# Altium footprint library PcbLib1.PcbLib: 102 footprints (part 1 of 7)
Each footprint in its own frame and in the unit in brackets; x right, y up, seen from the top. Pads: shape width x height; smd on the part's side, far side on the other; paste and mask are expansions set on the pad; w line width, h text height; cw(c..) or ccw(c..) is an arc to the next point about the centre after c.
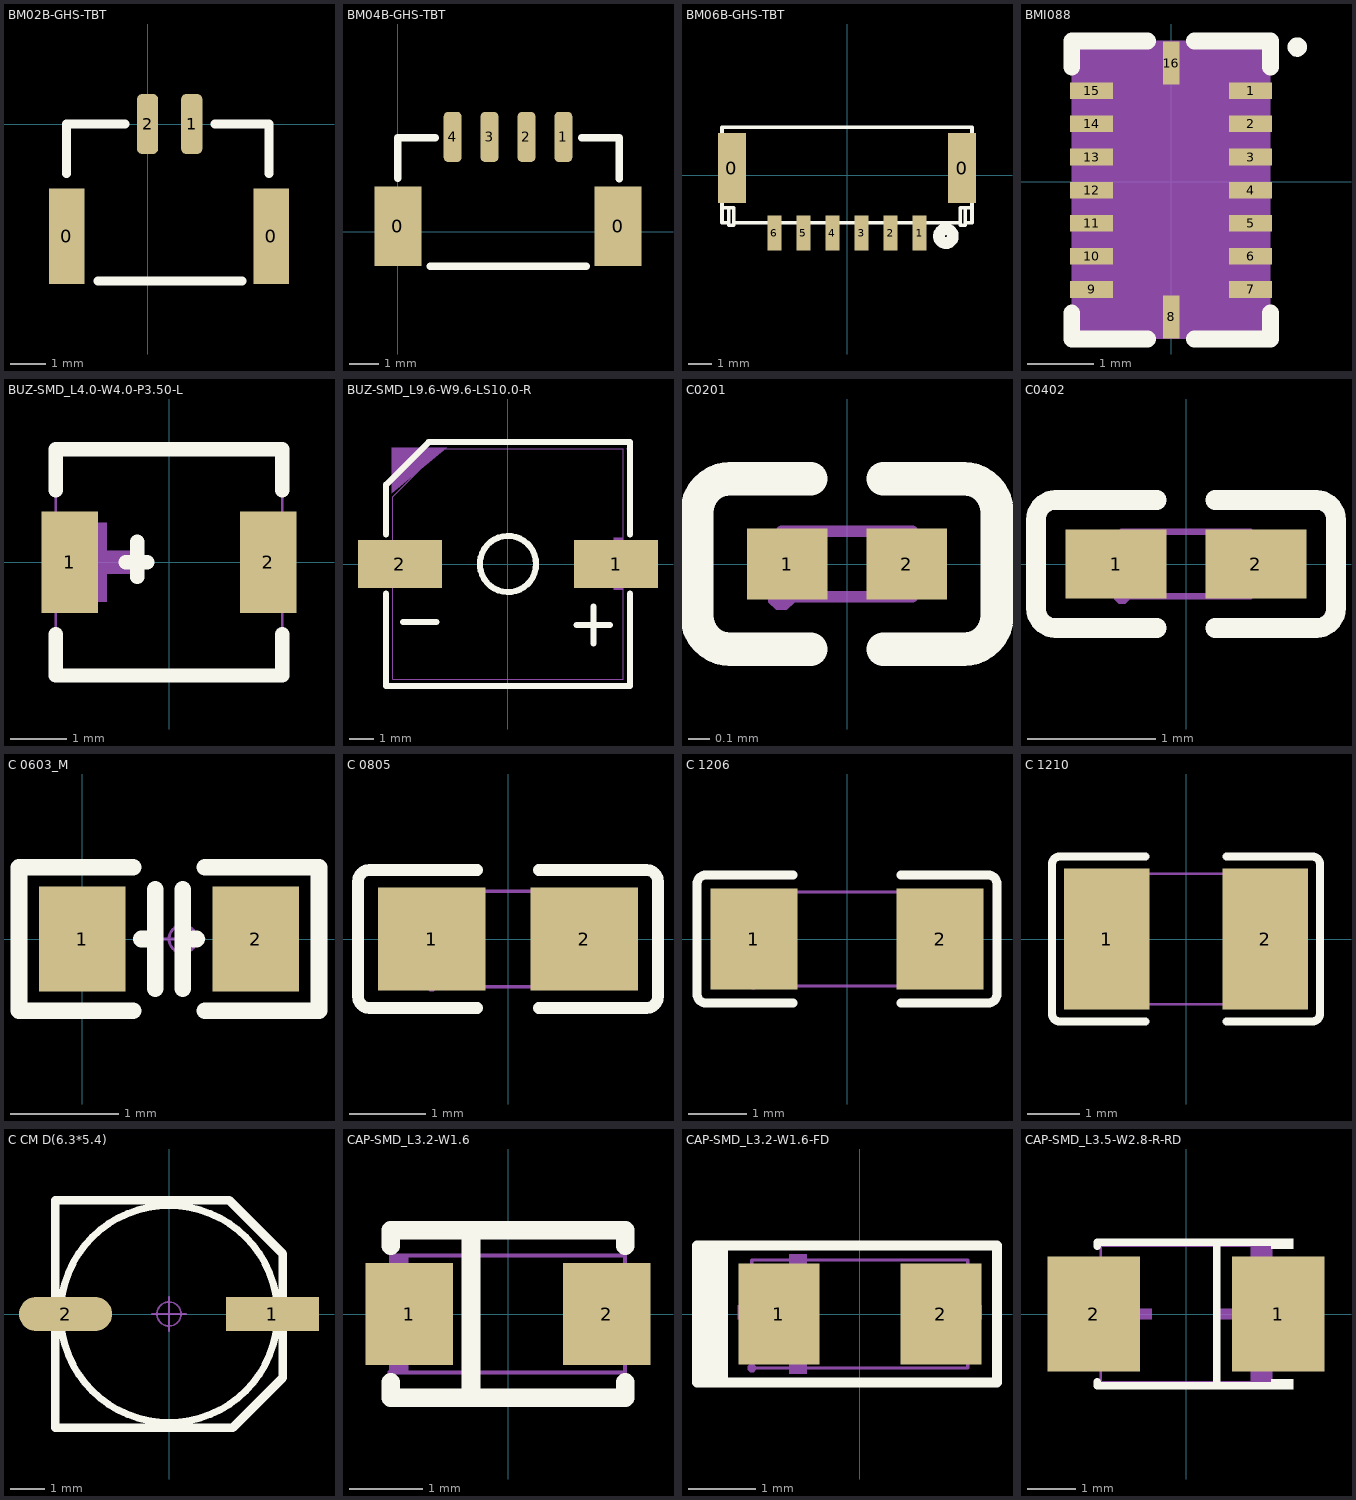
[diagram p0: the footprints below, top view; thin cyan lines are the x and y axes]

## BM02B-GHS-TBT [mm]
pads (4):
  rect 1.016x2.7 smd: 0(-2.286,-3.175) 0(3.5,-3.175)
  rrect50% 0.6x1.7 smd: 1(1.25,0) 2(0,0)
Top Overlay:
  lines w0.254: -2.286,-1.397 -2.286,0 -0.635,0 ; -1.397,-4.445 2.667,-4.445 ; 1.905,0 3.429,0 3.429,-1.397
3D body "SM02B.STEP": height 2.9, standoff -0.1, extent -1.359,-4.445 2.629,0.542

## BM04B-GHS-TBT [mm]
height 1.45
pads (6):
  rect 1.6x2.7 smd: 0(0,0.177) 0(7.45,0.177)
  rrect50% 0.6x1.7 smd: 1(5.6,3.2) 2(4.35,3.2) 3(3.1,3.2) 4(1.85,3.2)
Top Overlay:
  lines w0.254: 0,1.803 0,3.175 1.27,3.175 ; 1.092,-1.168 6.375,-1.168 ; 6.223,3.175 7.493,3.175 7.493,1.778
3D body "User Library-SM04B-GHS-TB.STEP": height 4.25, standoff -0.1, extent -0.366,-1.167 7.884,3.683

## BM06B-GHS-TBT [mm] "A1257WR-S-6P"
height 1.5
pads (8):
  rect 1.2x3 smd: 0(-4.95,0.3) 0(4.95,0.3)
  rect 0.6x1.5 smd: 1(3.125,-2.5) 2(1.875,-2.5) 3(0.625,-2.5) 4(-0.625,-2.5) 5(-1.875,-2.5) 6(-3.125,-2.5)
Top Overlay:
  circle w0.5: c4.251,-2.627 r0.3
  lines w0.102: -3.225,-2.15 -3.225,-2.85 -3.025,-2.85 -3.025,-2.15 ; -1.975,-2.15 -1.975,-2.85 -1.775,-2.85 -1.775,-2.15 ; -0.725,-2.15 -0.725,-2.85 -0.525,-2.85 -0.525,-2.15 ; 0.525,-2.15 0.525,-2.85 0.725,-2.85 0.725,-2.15 ; 1.775,-2.15 1.775,-2.85 1.975,-2.85 1.975,-2.15 ; 3.025,-2.15 3.025,-2.85 3.225,-2.85 3.225,-2.15
  lines w0.152: -5.075,-2.05 -5.375,-2.05 -5.375,-1.4 ; -5.075,-1.4 -5.075,-2.15 -4.875,-2.15 -4.875,-2.05 ; -3.225,-2.05 -3.225,-2.15 -3.025,-2.15 -3.025,-2.05 ; -1.975,-2.05 -1.975,-2.15 -1.775,-2.15 -1.775,-2.05 ; -0.725,-2.05 -0.725,-2.15 -0.525,-2.15 -0.525,-2.05 ; 0.525,-2.05 0.525,-2.15 0.725,-2.15 0.725,-2.05 ; 1.775,-2.05 1.775,-2.15 1.975,-2.15 1.975,-2.05 ; 3.025,-2.05 3.025,-2.15 3.225,-2.15 3.225,-2.05 ; 5.075,-2.05 5.375,-2.05 5.375,-1.4 ; 5.075,-1.4 5.075,-2.15 4.875,-2.15 4.875,-2.05 ; -5.375,-1.4 -5.375,2.05 5.375,2.05 5.375,-1.4 ; -5.375,-1.4 -4.875,-1.4 -4.875,-2.05 ; -4.875,-2.05 4.875,-2.05 ; 4.875,-2.05 4.875,-1.4 5.375,-1.4
3D body "A1257WR-S-6P.stp": height 4.4, standoff 0, extent -5.375,-2.8 5.375,2.1

## BMI088 [mm]
height 5
pads (16):
  rect 0.65x0.25 smd: 1(1.2,1.371) 2(1.2,0.871) 3(1.2,0.371) 4(1.2,-0.129) 5(1.2,-0.629) 6(1.2,-1.129) 7(1.2,-1.629) 9(-1.2,-1.629) 10(-1.2,-1.129) 11(-1.2,-0.629) 12(-1.2,-0.129) 13(-1.2,0.371) 14(-1.2,0.871) 15(-1.2,1.371)
  rect 0.25x0.65 smd: 8(0,-2.042) 16(0,1.788)
Top Overlay:
  circle w0.152: c1.905,2.032 r0.071
  lines w0.254: -1.5,-1.985 -1.5,-2.377 -0.356,-2.377 ; -1.5,1.727 -1.5,2.123 -0.356,2.123 ; 0.356,-2.377 1.5,-2.377 1.5,-1.985 ; 0.356,2.123 1.5,2.123 1.5,1.727
Mechanical 4:
  region: 1.5,2.123 1.5,-2.377 -1.5,-2.377 -1.5,2.123
Mechanical 5:
  region: -1.4,1.496 -0.925,1.496 -0.925,1.246 -1.4,1.246
  region: -1.4,0.996 -0.925,0.996 -0.925,0.746 -1.4,0.746
  region: -1.4,0.496 -0.925,0.496 -0.925,0.246 -1.4,0.246
  region: -1.4,-0.004 -0.925,-0.004 -0.925,-0.254 -1.4,-0.254
  region: -1.4,-0.504 -0.925,-0.504 -0.925,-0.754 -1.4,-0.754
  region: -1.4,-1.004 -0.925,-1.004 -0.925,-1.254 -1.4,-1.254
  region: -1.4,-1.504 -0.925,-1.504 -0.925,-1.754 -1.4,-1.754
  region: 0.925,-1.504 1.4,-1.504 1.4,-1.754 0.925,-1.754
  region: 0.925,-1.004 1.4,-1.004 1.4,-1.254 0.925,-1.254
  region: 0.925,-0.504 1.4,-0.504 1.4,-0.754 0.925,-0.754
  region: 0.925,-0.004 1.4,-0.004 1.4,-0.254 0.925,-0.254
  region: 0.925,0.496 1.4,0.496 1.4,0.246 0.925,0.246
  region: 0.925,0.996 1.4,0.996 1.4,0.746 0.925,0.746
  region: 0.925,1.496 1.4,1.496 1.4,1.246 0.925,1.246
  region: -0.125,2.023 0.125,2.023 0.125,1.548 -0.125,1.548
  region: -0.125,-1.802 0.125,-1.802 0.125,-2.277 -0.125,-2.277
Mechanical 6:
  circle w0.06: c1.5,2.123 r0.03
3D body "LGA-16.STEP": height 1, standoff 0, extent -1.5,-2.377 1.5,2.123

## BUZ-SMD_L4.0-W4.0-P3.50-L [mm]
pads (2):
  rect 1x1.8 smd: 1(-1.75,0) 2(1.75,0)
Top Overlay:
  lines w0.254: -2,-1.27 -2,-2 2,-2 2,-1.27 ; -2,1.27 -2,2 2,2 2,1.27 ; -0.762,0 -0.381,0 ; -0.56,-0.26 -0.56,0.36
Mechanical 6:
  region: -2.1,0.2 -1.5,0.2 -1.5,0.7 -1.1,0.7 -1.1,0.2 -0.5,0.2 -0.5,-0.2 -1.1,-0.2 -1.1,-0.7 -1.5,-0.7 -1.5,-0.2 -2.1,-0.2
Mechanical 15:
  region: -1.94,-2 -1.94,-1.975 -1.975,-1.94 -2.025,-1.94 -2.06,-1.975 -2.06,-2 -2.06,-2.025 -2.025,-2.06 -1.975,-2.06 -1.94,-2.025
  region: 1.5,0.7 2,0.7 2,-0.7 1.5,-0.7
  region: -2,0.7 -1.5,0.7 -1.5,-0.7 -2,-0.7
  lines w0.051: -2,-2 -2,2 2,2 2,-2 -2,-2
3D body "SMD,4x4mm.STEP": height 2.01, standoff 0, extent -2,-2 2,2.01

## BUZ-SMD_L9.6-W9.6-LS10.0-R [mm]
pads (2):
  rect 3.5x2 smd: 1(4.5,0) 2(-4.5,0)
Top Overlay:
  circle w0.254: c0.001,0 r1.171
  lines w0.254: -5.079,-1.232 -5.079,-5.08 5.081,-5.08 5.081,-1.231 ; -5.079,1.232 -5.079,3.302 -3.301,5.08 5.081,5.08 5.081,1.231 ; -4.381,-2.413 -2.984,-2.413 ; 2.858,-2.54 4.255,-2.54 ; 3.557,-3.302 3.557,-1.778
Mechanical 6:
  region: -2.55,4.85 -4.85,4.85 -4.85,2.95
  region: -5.508,0.191 -3.349,0.191 -3.349,-0.191 -5.508,-0.191
  region: 4.41,-1.07 4.41,1.089 4.791,1.089 4.791,-1.07
  region: 3.493,0.191 5.652,0.191 5.652,-0.191 3.493,-0.191
Mechanical 15:
  region: -3.3,-0.75 -5,-0.75 -5,0.75 -3.3,0.75
  region: 3.3,0.75 5,0.75 5,-0.75 3.3,-0.75
  region: 5.06,4.8 5.06,4.825 5.025,4.86 4.975,4.86 4.94,4.825 4.94,4.8 4.94,4.775 4.975,4.74 5.025,4.74 5.06,4.775
  lines w0.051: -4.8,-4.8 -4.8,2.8 -2.8,4.8 4.8,4.8 4.8,-4.8 -4.8,-4.8

## C0201 [mm]
pads (2):
  rect 0.368x0.324 smd paste-100 mask+0.051: 1(-0.274,0) 2(0.274,0)
Top Overlay:
  lines w0.152: -0.166,-0.391 -0.535,-0.391 cw(c-0.535,-0.238) -0.687,-0.238 -0.687,0.238 cw(c-0.535,0.238) -0.535,0.391 -0.166,0.391 ; 0.166,-0.391 0.535,-0.391 ccw(c0.535,-0.238) 0.687,-0.238 0.687,0.238 ccw(c0.535,0.238) 0.535,0.391 0.166,0.391
Top Paste:
  region: 0.081,-0.138 0.081,0.138 0.105,0.162 0.434,0.162 0.458,0.138 0.458,-0.138 0.434,-0.162 0.105,-0.162
  region: -0.081,-0.138 -0.081,0.138 -0.105,0.162 -0.434,0.162 -0.458,0.138 -0.458,-0.138 -0.434,-0.162 -0.105,-0.162
Mechanical 15:
  region: -0.3,-0.15 -0.3,0.15 -0.15,0.15 -0.15,-0.15
  region: 0.3,-0.15 0.3,0.15 0.15,0.15 0.15,-0.15
  region: -0.24,-0.15 -0.24,-0.125 -0.275,-0.09 -0.325,-0.09 -0.36,-0.125 -0.36,-0.15 -0.36,-0.175 -0.325,-0.21 -0.275,-0.21 -0.24,-0.175 -0.24,-0.15
  lines w0.051: -0.3,-0.15 -0.3,0.15 0.3,0.15 0.3,-0.15 -0.3,-0.15
3D body "02012314.STEP": height 0.16, standoff -0.15, extent -0.3,-0.15 0.3,0.15

## C0402 [mm]
pads (2):
  rect 0.79x0.54 smd paste-100 mask+0.051: 1(-0.545,0) 2(0.545,0)
Top Overlay:
  lines w0.152: -0.226,-0.499 -1.016,-0.499 cw(c-1.016,-0.346) -1.169,-0.346 -1.169,0.346 cw(c-1.016,0.346) -1.016,0.499 -0.226,0.499 ; 0.226,-0.499 1.016,-0.499 ccw(c1.016,-0.346) 1.169,-0.346 1.169,0.346 ccw(c1.016,0.346) 1.016,0.499 0.226,0.499
Top Paste:
  region: -0.18,0.225 -0.18,-0.225 -0.25,-0.275 -0.73,-0.275 -0.78,-0.225 -0.78,0.225 -0.73,0.275 -0.25,0.275
  region: 0.78,0.225 0.78,-0.225 0.73,-0.275 0.25,-0.275 0.18,-0.225 0.18,0.225 0.25,0.275 0.73,0.275
Mechanical 15:
  region: -0.5,-0.25 -0.5,0.25 -0.25,0.25 -0.25,-0.25
  region: 0.5,-0.25 0.5,0.25 0.25,0.25 0.25,-0.25
  region: -0.44,-0.25 -0.44,-0.225 -0.475,-0.19 -0.525,-0.19 -0.56,-0.225 -0.56,-0.25 -0.56,-0.275 -0.525,-0.31 -0.475,-0.31 -0.44,-0.275 -0.44,-0.25
  lines w0.051: -0.5,-0.25 -0.5,0.25 0.5,0.25 0.5,-0.25 -0.5,-0.25
3D body "0402214.STEP": height 0.25, standoff -0.25, extent -0.5,-0.25 0.5,0.25

## C 0603_M [mm] "无极性贴片电容"
pads (2):
  rect 0.8x0.965 smd: 1(0,0) 2(1.6,0)
Top Overlay:
  lines w0.152: 0.47,-0.66 -0.584,-0.66 -0.584,0.66 0.47,0.66 ; 0.546,0 0.673,0 ; 0.673,-0.457 0.673,0.457 ; 0.927,-0.457 0.927,0.457 ; 0.927,0 1.054,0 ; 1.13,-0.66 2.184,-0.66 2.184,0.66 1.13,0.66
Mechanical 15:
  circle w0.025: c0.927,0 r0.127
  lines w0.025: 0.727,0 1.127,0 ; 0.927,-0.2 0.927,0.2
3D body "C 0603.STEP": height 0.81, standoff -0.01, extent -0.013,-0.41 1.587,0.41

## C 0805 [mm]
pads (2):
  rect 1.41x1.35 smd paste-100 mask+0.051: 1(-1,0) 2(1,0)
Top Overlay:
  lines w0.152: -0.401,-0.904 -1.811,-0.904 cw(c-1.811,-0.751) -1.964,-0.751 -1.964,0.751 cw(c-1.811,0.751) -1.811,0.904 -0.401,0.904 ; 0.401,-0.904 1.811,-0.904 ccw(c1.811,-0.751) 1.964,-0.751 1.964,0.751 ccw(c1.811,0.751) 1.811,0.904 0.401,0.904
Top Paste:
  region: -1.675,-0.62 -1.675,0.66 -1.625,0.71 -0.475,0.71 -0.425,0.66 -0.42,0.25 -0.87,0.25 -0.87,-0.2 -0.43,-0.2 -0.425,-0.62 -0.475,-0.67 -1.625,-0.67
  region: 0.475,-0.62 0.475,-0.2 0.92,-0.2 0.92,0.25 0.48,0.25 0.475,0.66 0.525,0.71 1.675,0.71 1.725,0.66 1.725,-0.62 1.675,-0.67 0.525,-0.67
Mechanical 15:
  region: -1,-0.625 -1,0.625 -0.5,0.625 -0.5,-0.625
  region: 1,0.625 1,-0.625 0.5,-0.625 0.5,0.625
  region: -0.94,-0.625 -0.94,-0.6 -0.975,-0.565 -1.025,-0.565 -1.06,-0.6 -1.06,-0.625 -1.06,-0.65 -1.025,-0.685 -0.975,-0.685 -0.94,-0.65 -0.94,-0.625
  lines w0.051: -1,-0.625 -1,0.625 1,0.625 1,-0.625 -1,-0.625
3D body "0805-214.STEP": height 1.29, standoff -0.02, extent -1,-0.65 1,0.65

## C 1206 [mm]
pads (2):
  rect 1.485x1.728 smd paste-100 mask+0.051: 1(-1.593,0) 2(1.593,0)
Top Overlay:
  lines w0.152: -0.926,-1.093 -2.411,-1.093 cw(c-2.411,-0.94) -2.564,-0.94 -2.564,0.94 cw(c-2.411,0.94) -2.411,1.093 -0.926,1.093 ; 0.926,-1.093 2.411,-1.093 ccw(c2.411,-0.94) 2.564,-0.94 2.564,0.94 ccw(c2.411,0.94) 2.411,1.093 0.926,1.093
Top Paste:
  region: 0.85,-0.764 0.85,-0.394 0.95,-0.294 1.255,-0.294 1.355,-0.194 1.355,0.194 1.255,0.294 0.95,0.294 0.85,0.394 0.85,0.764 0.95,0.864 2.235,0.864 2.335,0.764 2.335,-0.764 2.235,-0.864 0.95,-0.864
  region: -0.85,-0.764 -0.85,-0.394 -0.95,-0.294 -1.255,-0.294 -1.355,-0.194 -1.355,0.194 -1.255,0.294 -0.95,0.294 -0.85,0.394 -0.85,0.764 -0.95,0.864 -2.235,0.864 -2.335,0.764 -2.335,-0.764 -2.235,-0.864 -0.95,-0.864
Mechanical 15:
  region: -1.54,-0.8 -1.54,-0.775 -1.575,-0.74 -1.625,-0.74 -1.66,-0.775 -1.66,-0.8 -1.66,-0.825 -1.625,-0.86 -1.575,-0.86 -1.54,-0.825 -1.54,-0.8
  region: -1.6,-0.8 -1.6,0.8 -1.1,0.8 -1.1,-0.8
  region: 1.6,-0.8 1.6,0.8 1.1,0.8 1.1,-0.8
  lines w0.051: -1.6,-0.8 -1.6,0.8 1.6,0.8 1.6,-0.8 -1.6,-0.8
3D body "1206214.STEP": height 1.29, standoff -0.02, extent -1.6,-0.8 1.6,0.8

## C 1210 [mm]
pads (2):
  rect 1.635x2.7 smd paste-100 mask+0.051: 1(-1.517,0) 2(1.517,0)
Top Overlay:
  lines w0.152: -0.776,-1.579 -2.411,-1.579 cw(c-2.411,-1.426) -2.564,-1.426 -2.564,1.426 cw(c-2.411,1.426) -2.411,1.579 -0.776,1.579 ; 0.776,-1.579 2.411,-1.579 ccw(c2.411,-1.426) 2.564,-1.426 2.564,1.426 ccw(c2.411,1.426) 2.411,1.579 0.776,1.579
Top Paste:
  region: -0.7,-1.25 -0.7,-0.559 -0.8,-0.459 -1.156,-0.459 -1.256,-0.359 -1.256,0.359 -1.156,0.459 -0.8,0.459 -0.7,0.559 -0.7,1.25 -0.8,1.35 -2.235,1.35 -2.335,1.25 -2.335,-1.25 -2.235,-1.35 -0.8,-1.35
  region: 0.7,-1.25 0.7,-0.559 0.8,-0.459 1.156,-0.459 1.256,-0.359 1.256,0.359 1.156,0.459 0.8,0.459 0.7,0.559 0.7,1.25 0.8,1.35 2.235,1.35 2.335,1.25 2.335,-1.25 2.235,-1.35 0.8,-1.35
Mechanical 15:
  region: 1.6,-1.25 1.6,1.25 1,1.25 1,-1.25
  region: -1.6,-1.25 -1.6,1.25 -1,1.25 -1,-1.25
  region: -1.54,-1.25 -1.54,-1.225 -1.575,-1.19 -1.625,-1.19 -1.66,-1.225 -1.66,-1.25 -1.66,-1.275 -1.625,-1.31 -1.575,-1.31 -1.54,-1.275 -1.54,-1.25
  lines w0.051: -1.6,-1.25 1.6,-1.25 1.6,1.25 -1.6,1.25 -1.6,-1.25
3D body "1210214.STEP": height 0.96, standoff 0.06, extent -1.6,-1.26 1.6,1.26

## C CM D(6.3*5.4) [mm] "贴片电解电容，直径6.3mm，高5.4mm"
height 5.4
pads (2):
  rect 2.7x1 smd: 1(3,0)
  oval 2.7x1 smd: 2(-3,0)
Top Overlay:
  circle w0.2: c0,0 r3.15
  lines w0.254: -3.3,-3.3 -3.3,3.3 1.75,3.3 3.3,1.75 3.3,-1.85 1.85,-3.3 -3.3,-3.3
Mechanical 15:
  circle w0.05: c0,0 r0.35
  lines w0.05: -0.5,0 0.5,0 ; 0,-0.5 0,0.5
3D body "CM D(6.3X5.4).STEP": height 5.4, standoff -0.01, extent -3.5,-3.3 3.5,3.3

## CAP-SMD_L3.2-W1.6 [mm] "47uF ±20% 6.3V  钽电容"
pads (2):
  rect 1.2x1.4 smd: 1(-1.35,0) 2(1.35,0)
Top Overlay:
  region: -0.635,1.143 -0.381,1.143 -0.381,-1.143 -0.508,-1.143 -0.635,-1.143
  lines w0.254: -1.6,-0.931 -1.6,-1.143 -0.128,-1.143 1.6,-1.143 1.6,-0.931 ; -1.6,0.931 -1.6,1.143 1.6,1.143 1.6,0.931
Mechanical 6:
  region: -1.6,-0.8 -1.6,-0.4 -1.36,-0.4 -1.36,-0.8
  region: -1.6,0.8 -1.6,0.4 -1.36,0.4 -1.36,0.8
  region: -1.3,0.4 -1.3,-0.4 -1.18,-0.4 -1.18,0.4
  region: -1.48,0.06 -1.48,-0.06 -1,-0.06 -1,0.06
  region: 1.48,0.06 1.48,-0.06 1,-0.06 1,0.06
Mechanical 15:
  region: -1.56,-0.8 -1.56,-0.784 -1.583,-0.76 -1.617,-0.76 -1.64,-0.784 -1.64,-0.8 -1.64,-0.817 -1.617,-0.84 -1.583,-0.84 -1.56,-0.817
  region: 0.8,0.6 1.6,0.6 1.6,-0.6 0.8,-0.6
  region: -0.8,-0.6 -1.6,-0.6 -1.6,0.6 -0.8,0.6
  lines w0.051: -1.6,-0.8 1.6,-0.8 1.6,0.8 -1.6,0.8 -1.6,-0.8
3D body "CASE-A-3216.STEP": height 1.69, standoff -0.01, extent -1.6,-0.8 1.6,0.8

## CAP-SMD_L3.2-W1.6-FD [mm] "48uf坦电容"
pads (2):
  rect 1.2x1.5 smd: 1(-1.2,0) 2(1.2,0)
Top Overlay:
  region: -2.032,1.016 -2.032,-1.016 -2.413,-1.016 -2.413,1.016
  lines w0.152: -2.032,-1.016 -2.413,-1.016 -2.413,1.016 -2.032,1.016 ; -2.032,-1.016 -2.032,1.016 ; -2.032,-1.016 2.032,-1.016 2.032,1.016 -2.032,1.016
Mechanical 6:
  region: 1.016,0.127 1.803,0.127 1.803,-0.076 1.016,-0.076
  region: -1.501,-0.394 -1.501,0.394 -1.298,0.394 -1.298,-0.394
  region: -1.806,0.127 -1.019,0.127 -1.019,-0.076 -1.806,-0.076
  region: -0.79,-0.889 -0.79,-0.381 -1.044,-0.381 -1.044,-0.889
  region: -0.79,0.381 -0.79,0.889 -1.044,0.889 -1.044,0.381
Mechanical 15:
  region: -1.54,-0.8 -1.54,-0.775 -1.575,-0.74 -1.625,-0.74 -1.66,-0.775 -1.66,-0.8 -1.66,-0.825 -1.625,-0.86 -1.575,-0.86 -1.54,-0.825
  region: -1.6,0.6 -0.8,0.6 -0.8,-0.6 -1.6,-0.6
  region: 0.8,0.6 1.6,0.6 1.6,-0.6 0.8,-0.6
  lines w0.051: -1.6,-0.8 -1.6,0.8 1.6,0.8 1.6,-0.8 -1.6,-0.8

## CAP-SMD_L3.5-W2.8-R-RD [mm]
pads (2):
  rect 1.9x2.376 smd: 1(1.899,0) 2(-1.899,0)
Top Overlay:
  region: 1.75,-1.552 1.75,-1.34 2.207,-1.34 2.207,-1.552
  region: 1.75,1.552 1.75,1.34 2.207,1.34 2.207,1.552
  lines w0.152: -1.826,-1.391 -1.826,-1.476 1.826,-1.476 ; -1.826,1.391 -1.826,1.476 1.826,1.476 ; 0.635,-1.476 0.635,1.476
Mechanical 6:
  region: 1.75,1.4 1.75,0.7 1.33,0.7 1.33,1.4
  region: 1.75,-1.4 1.75,-0.7 1.33,-0.7 1.33,-1.4
  region: 1.225,-0.7 1.225,0.7 1.015,0.7 1.015,-0.7
  region: 1.54,-0.105 1.54,0.105 0.7,0.105 0.7,-0.105
  region: -1.54,-0.105 -1.54,0.105 -0.7,0.105 -0.7,-0.105
Mechanical 15:
  region: 1.75,-1.1 1.75,1.1 1.05,1.1 1.05,-1.1
  region: -1.75,-1.1 -1.75,1.1 -1.05,1.1 -1.05,-1.1
  region: 1.81,1.4 1.81,1.425 1.775,1.46 1.725,1.46 1.69,1.425 1.69,1.4 1.69,1.375 1.725,1.34 1.775,1.34 1.81,1.375
  lines w0.051: -1.75,-1.4 1.75,-1.4 1.75,1.4 -1.75,1.4 -1.75,-1.4
3D body "CASE-B-3528.STEP": height 1.97, standoff -0.03, extent -1.85,-1.4 1.85,1.4